# Altium footprint library 15EDG.PcbLib: 46 footprints (part 3 of 3)
Each footprint in its own frame and in the unit in brackets; x right, y up, seen from the top. Pads: shape width x height; smd on the part's side, far side on the other; paste and mask are expansions set on the pad; w line width, h text height; cw(c..) or ccw(c..) is an arc to the next point about the centre after c.
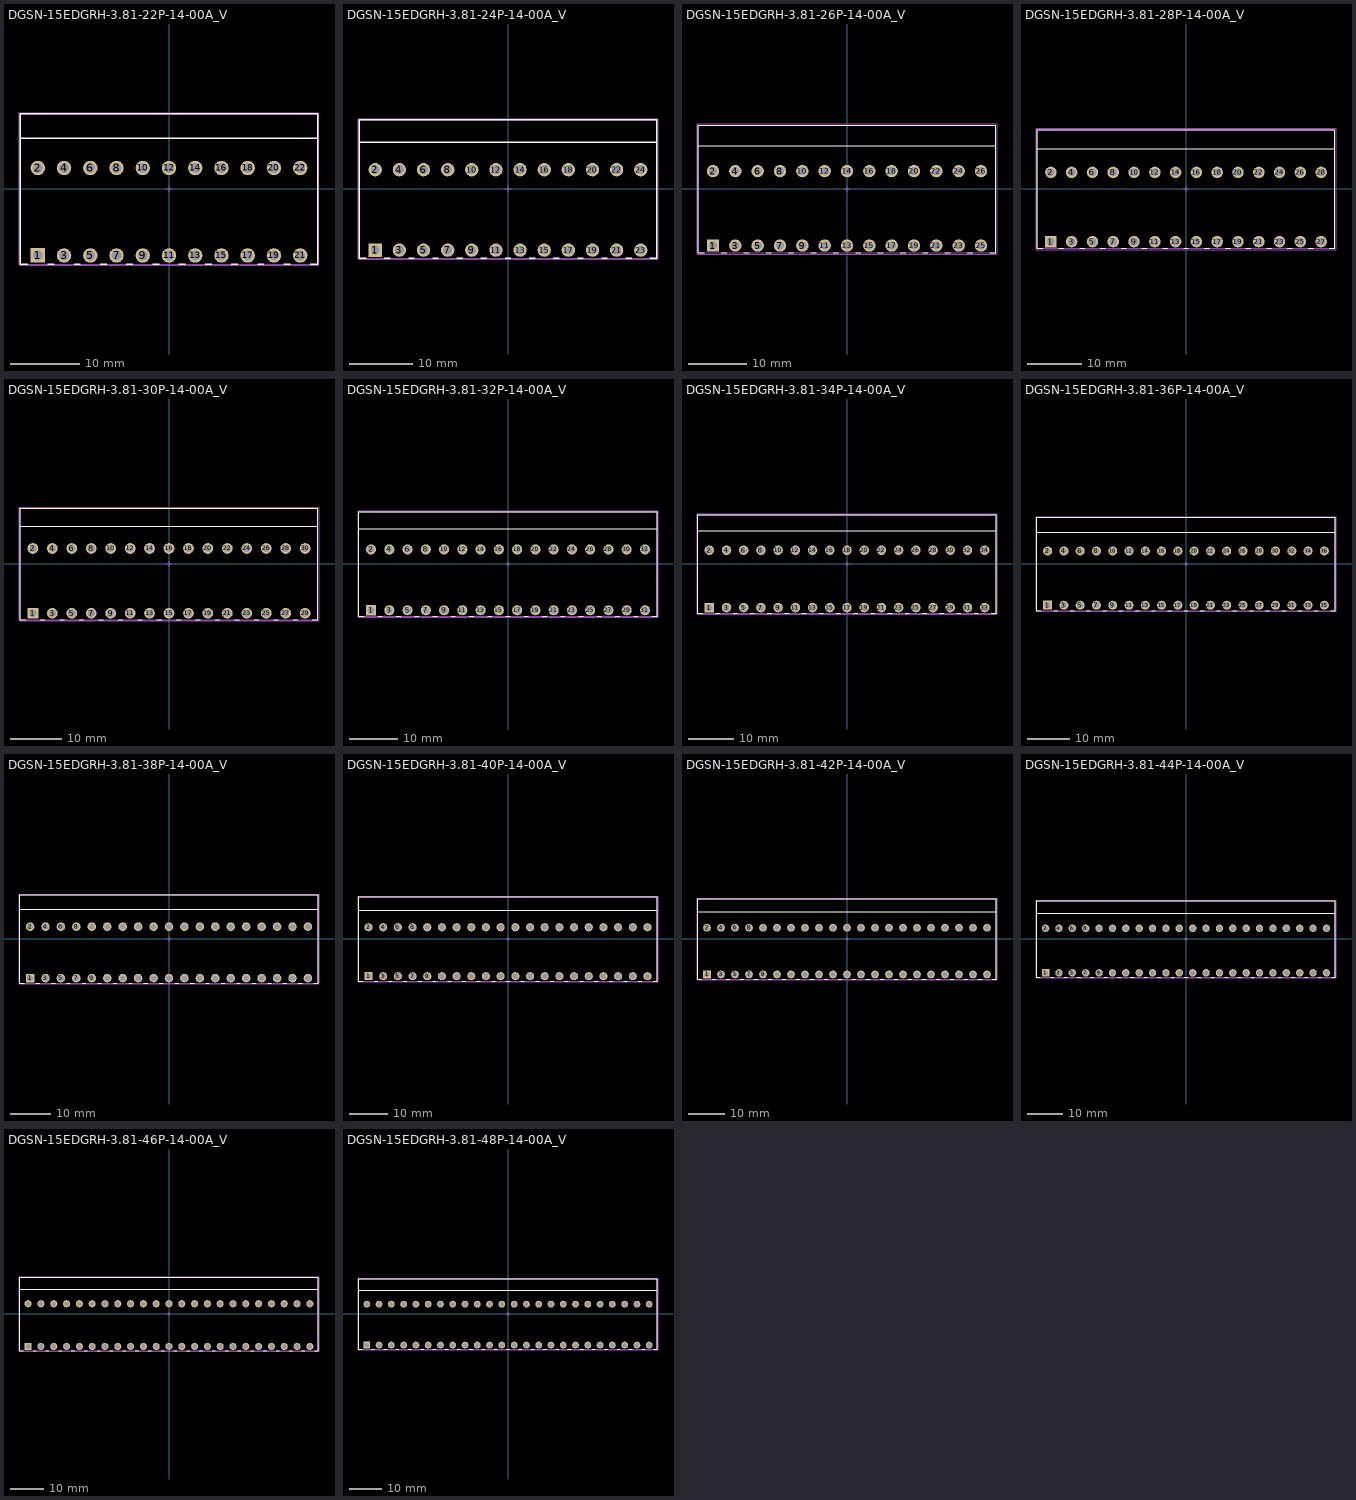
[diagram p2: the footprints below, top view; thin cyan lines are the x and y axes]

## DGSN-15EDGRH-3.81-22P-14-00A_V [mm] "Terminal Block, 22-Pin, Body 43.15x21.80mm, Pitch 3.81mm"
height 22.7
pads (22):
  rect 2.1x2.1 hole 1.4: 1(-19.05,-9.65)
  round 2.1 hole 1.4: 2(-19.05,3.05) 3(-15.24,-9.65) 4(-15.24,3.05) 5(-11.43,-9.65) 6(-11.43,3.05) 7(-7.62,-9.65) 8(-7.62,3.05) 9(-3.81,-9.65) 10(-3.81,3.05) 11(0,-9.65) 12(0,3.05) 13(3.81,-9.65) 14(3.81,3.05) 15(7.62,-9.65) 16(7.62,3.05) 17(11.43,-9.65) 18(11.43,3.05) 19(15.24,-9.65) 20(15.24,3.05) 21(19.05,-9.65) 22(19.05,3.05)
Top Overlay:
  lines w0.2: -21.575,7.4 21.575,7.4 ; -20.5,-10.9 -21.575,-10.9 -21.575,10.9 21.575,10.9 21.575,-10.9 20.5,-10.9 ; -17.6,-10.9 -16.69,-10.9 ; -13.79,-10.9 -12.88,-10.9 ; -9.98,-10.9 -9.07,-10.9 ; -6.17,-10.9 -5.26,-10.9 ; -2.36,-10.9 -1.45,-10.9 ; 1.45,-10.9 2.36,-10.9 ; 5.26,-10.9 6.17,-10.9 ; 9.07,-10.9 9.98,-10.9 ; 12.88,-10.9 13.79,-10.9 ; 16.69,-10.9 17.6,-10.9
Mechanical 13:
  lines w0.1: -21.575,-10.9 -21.575,10.9 21.575,10.9 21.575,-10.9 -21.575,-10.9
Mechanical 15:
  lines w0.05: -21.775,-11.1 -21.775,11.1 21.775,11.1 21.775,-11.1 -21.775,-11.1
  lines w0.1: -0.5,0 0.5,0 ; 0,-0.5 0,0.5
3D body "15EDGRH-3.81-22P-14-00AH.STEP": height 22.7, standoff -3.5, extent -21.565,-10.9 21.575,10.9

## DGSN-15EDGRH-3.81-24P-14-00A_V [mm] "Terminal Block, 24-Pin, Body 46.96x21.80mm, Pitch 3.81mm"
height 22.7
pads (24):
  rect 2.1x2.1 hole 1.4: 1(-20.955,-9.65)
  round 2.1 hole 1.4: 2(-20.955,3.05) 3(-17.145,-9.65) 4(-17.145,3.05) 5(-13.335,-9.65) 6(-13.335,3.05) 7(-9.525,-9.65) 8(-9.525,3.05) 9(-5.715,-9.65) 10(-5.715,3.05) 11(-1.905,-9.65) 12(-1.905,3.05) 13(1.905,-9.65) 14(1.905,3.05) 15(5.715,-9.65) 16(5.715,3.05) 17(9.525,-9.65) 18(9.525,3.05) 19(13.335,-9.65) 20(13.335,3.05) 21(17.145,-9.65) 22(17.145,3.05) 23(20.955,-9.65) 24(20.955,3.05)
Top Overlay:
  lines w0.2: -23.48,7.4 23.48,7.4 ; -22.405,-10.9 -23.48,-10.9 -23.48,10.9 23.48,10.9 23.48,-10.9 22.405,-10.9 ; -19.505,-10.9 -18.595,-10.9 ; -15.695,-10.9 -14.785,-10.9 ; -11.885,-10.9 -10.975,-10.9 ; -8.075,-10.9 -7.165,-10.9 ; -4.265,-10.9 -3.355,-10.9 ; -0.455,-10.9 0.455,-10.9 ; 3.355,-10.9 4.265,-10.9 ; 7.165,-10.9 8.075,-10.9 ; 10.975,-10.9 11.885,-10.9 ; 14.785,-10.9 15.695,-10.9 ; 18.595,-10.9 19.505,-10.9
Mechanical 13:
  lines w0.1: -23.48,-10.9 -23.48,10.9 23.48,10.9 23.48,-10.9 -23.48,-10.9
Mechanical 15:
  lines w0.05: -23.68,-11.1 -23.68,11.1 23.68,11.1 23.68,-11.1 -23.68,-11.1
  lines w0.1: -0.5,0 0.5,0 ; 0,-0.5 0,0.5
3D body "15EDGRH-3.81-24P-14-00AH.STEP": height 22.7, standoff -3.5, extent -23.47,-10.9 23.48,10.9

## DGSN-15EDGRH-3.81-26P-14-00A_V [mm] "Terminal Block, 26-Pin, Body 50.77x21.80mm, Pitch 3.81mm"
height 22.7
pads (26):
  rect 2.1x2.1 hole 1.4: 1(-22.86,-9.65)
  round 2.1 hole 1.4: 2(-22.86,3.05) 3(-19.05,-9.65) 4(-19.05,3.05) 5(-15.24,-9.65) 6(-15.24,3.05) 7(-11.43,-9.65) 8(-11.43,3.05) 9(-7.62,-9.65) 10(-7.62,3.05) 11(-3.81,-9.65) 12(-3.81,3.05) 13(0,-9.65) 14(0,3.05) 15(3.81,-9.65) 16(3.81,3.05) 17(7.62,-9.65) 18(7.62,3.05) 19(11.43,-9.65) 20(11.43,3.05) 21(15.24,-9.65) 22(15.24,3.05) 23(19.05,-9.65) 24(19.05,3.05) 25(22.86,-9.65) 26(22.86,3.05)
Top Overlay:
  lines w0.2: -25.385,7.4 25.385,7.4 ; -24.31,-10.9 -25.385,-10.9 -25.385,10.9 25.385,10.9 25.385,-10.9 24.31,-10.9 ; -21.41,-10.9 -20.5,-10.9 ; -17.6,-10.9 -16.69,-10.9 ; -13.79,-10.9 -12.88,-10.9 ; -9.98,-10.9 -9.07,-10.9 ; -6.17,-10.9 -5.26,-10.9 ; -2.36,-10.9 -1.45,-10.9 ; 1.45,-10.9 2.36,-10.9 ; 5.26,-10.9 6.17,-10.9 ; 9.07,-10.9 9.98,-10.9 ; 12.88,-10.9 13.79,-10.9 ; 16.69,-10.9 17.6,-10.9 ; 20.5,-10.9 21.41,-10.9
Mechanical 13:
  lines w0.1: -25.385,-10.9 -25.385,10.9 25.385,10.9 25.385,-10.9 -25.385,-10.9
Mechanical 15:
  lines w0.05: -25.585,-11.1 -25.585,11.1 25.585,11.1 25.585,-11.1 -25.585,-11.1
  lines w0.1: -0.5,0 0.5,0 ; 0,-0.5 0,0.5
3D body "15EDGRH-3.81-26P-14-00AH.STEP": height 22.7, standoff -3.5, extent -25.375,-10.9 25.385,10.9

## DGSN-15EDGRH-3.81-28P-14-00A_V [mm] "Terminal Block, 28-Pin, Body 54.58x21.80mm, Pitch 3.81mm"
height 22.7
pads (28):
  rect 2.1x2.1 hole 1.4: 1(-24.765,-9.65)
  round 2.1 hole 1.4: 2(-24.765,3.05) 3(-20.955,-9.65) 4(-20.955,3.05) 5(-17.145,-9.65) 6(-17.145,3.05) 7(-13.335,-9.65) 8(-13.335,3.05) 9(-9.525,-9.65) 10(-9.525,3.05) 11(-5.715,-9.65) 12(-5.715,3.05) 13(-1.905,-9.65) 14(-1.905,3.05) 15(1.905,-9.65) 16(1.905,3.05) 17(5.715,-9.65) 18(5.715,3.05) 19(9.525,-9.65) 20(9.525,3.05) 21(13.335,-9.65) 22(13.335,3.05) 23(17.145,-9.65) 24(17.145,3.05) 25(20.955,-9.65) 26(20.955,3.05) 27(24.765,-9.65) 28(24.765,3.05)
Top Overlay:
  lines w0.2: -27.29,7.4 27.29,7.4 ; -26.215,-10.9 -27.29,-10.9 -27.29,10.9 27.29,10.9 27.29,-10.9 26.215,-10.9 ; -23.315,-10.9 -22.405,-10.9 ; -19.505,-10.9 -18.595,-10.9 ; -15.695,-10.9 -14.785,-10.9 ; -11.885,-10.9 -10.975,-10.9 ; -8.075,-10.9 -7.165,-10.9 ; -4.265,-10.9 -3.355,-10.9 ; -0.455,-10.9 0.455,-10.9 ; 3.355,-10.9 4.265,-10.9 ; 7.165,-10.9 8.075,-10.9 ; 10.975,-10.9 11.885,-10.9 ; 14.785,-10.9 15.695,-10.9 ; 18.595,-10.9 19.505,-10.9 ; 22.405,-10.9 23.315,-10.9
Mechanical 13:
  lines w0.1: -27.29,-10.9 -27.29,10.9 27.29,10.9 27.29,-10.9 -27.29,-10.9
Mechanical 15:
  lines w0.05: -27.49,-11.1 -27.49,11.1 27.49,11.1 27.49,-11.1 -27.49,-11.1
  lines w0.1: -0.5,0 0.5,0 ; 0,-0.5 0,0.5
3D body "15EDGRH-3.81-30P-14-00AH.STEP": height 22.7, standoff -3.5, extent -27.28,-10.9 31.1,10.9

## DGSN-15EDGRH-3.81-30P-14-00A_V [mm] "Terminal Block, 30-Pin, Body 58.39x21.80mm, Pitch 3.81mm"
height 22.7
pads (30):
  rect 2.1x2.1 hole 1.4: 1(-26.67,-9.65)
  round 2.1 hole 1.4: 2(-26.67,3.05) 3(-22.86,-9.65) 4(-22.86,3.05) 5(-19.05,-9.65) 6(-19.05,3.05) 7(-15.24,-9.65) 8(-15.24,3.05) 9(-11.43,-9.65) 10(-11.43,3.05) 11(-7.62,-9.65) 12(-7.62,3.05) 13(-3.81,-9.65) 14(-3.81,3.05) 15(0,-9.65) 16(0,3.05) 17(3.81,-9.65) 18(3.81,3.05) 19(7.62,-9.65) 20(7.62,3.05) 21(11.43,-9.65) 22(11.43,3.05) 23(15.24,-9.65) 24(15.24,3.05) 25(19.05,-9.65) 26(19.05,3.05) 27(22.86,-9.65) 28(22.86,3.05) 29(26.67,-9.65) 30(26.67,3.05)
Top Overlay:
  lines w0.2: -29.195,7.4 29.195,7.4 ; -28.12,-10.9 -29.195,-10.9 -29.195,10.9 29.195,10.9 29.195,-10.9 28.12,-10.9 ; -25.22,-10.9 -24.31,-10.9 ; -21.41,-10.9 -20.5,-10.9 ; -17.6,-10.9 -16.69,-10.9 ; -13.79,-10.9 -12.88,-10.9 ; -9.98,-10.9 -9.07,-10.9 ; -6.17,-10.9 -5.26,-10.9 ; -2.36,-10.9 -1.45,-10.9 ; 1.45,-10.9 2.36,-10.9 ; 5.26,-10.9 6.17,-10.9 ; 9.07,-10.9 9.98,-10.9 ; 12.88,-10.9 13.79,-10.9 ; 16.69,-10.9 17.6,-10.9 ; 20.5,-10.9 21.41,-10.9 ; 24.31,-10.9 25.22,-10.9
Mechanical 13:
  lines w0.1: -29.195,-10.9 -29.195,10.9 29.195,10.9 29.195,-10.9 -29.195,-10.9
Mechanical 15:
  lines w0.05: -29.395,-11.1 -29.395,11.1 29.395,11.1 29.395,-11.1 -29.395,-11.1
  lines w0.1: -0.5,0 0.5,0 ; 0,-0.5 0,0.5
3D body "15EDGRH-3.81-30P-14-00AH.STEP": height 22.7, standoff -3.5, extent -29.185,-10.9 29.195,10.9

## DGSN-15EDGRH-3.81-32P-14-00A_V [mm] "Terminal Block, 32-Pin, Body 62.20x21.80mm, Pitch 3.81mm"
height 22.7
pads (32):
  rect 2.1x2.1 hole 1.4: 1(-28.575,-9.65)
  round 2.1 hole 1.4: 2(-28.575,3.05) 3(-24.765,-9.65) 4(-24.765,3.05) 5(-20.955,-9.65) 6(-20.955,3.05) 7(-17.145,-9.65) 8(-17.145,3.05) 9(-13.335,-9.65) 10(-13.335,3.05) 11(-9.525,-9.65) 12(-9.525,3.05) 13(-5.715,-9.65) 14(-5.715,3.05) 15(-1.905,-9.65) 16(-1.905,3.05) 17(1.905,-9.65) 18(1.905,3.05) 19(5.715,-9.65) 20(5.715,3.05) 21(9.525,-9.65) 22(9.525,3.05) 23(13.335,-9.65) 24(13.335,3.05) 25(17.145,-9.65) 26(17.145,3.05) 27(20.955,-9.65) 28(20.955,3.05) 29(24.765,-9.65) 30(24.765,3.05) 31(28.575,-9.65) 32(28.575,3.05)
Top Overlay:
  lines w0.2: -31.1,7.4 31.1,7.4 ; -30.025,-10.9 -31.1,-10.9 -31.1,10.9 31.1,10.9 31.1,-10.9 30.025,-10.9 ; -27.125,-10.9 -26.215,-10.9 ; -23.315,-10.9 -22.405,-10.9 ; -19.505,-10.9 -18.595,-10.9 ; -15.695,-10.9 -14.785,-10.9 ; -11.885,-10.9 -10.975,-10.9 ; -8.075,-10.9 -7.165,-10.9 ; -4.265,-10.9 -3.355,-10.9 ; -0.455,-10.9 0.455,-10.9 ; 3.355,-10.9 4.265,-10.9 ; 7.165,-10.9 8.075,-10.9 ; 10.975,-10.9 11.885,-10.9 ; 14.785,-10.9 15.695,-10.9 ; 18.595,-10.9 19.505,-10.9 ; 22.405,-10.9 23.315,-10.9 ; 26.215,-10.9 27.125,-10.9
Mechanical 13:
  lines w0.1: -31.1,-10.9 -31.1,10.9 31.1,10.9 31.1,-10.9 -31.1,-10.9
Mechanical 15:
  lines w0.05: -31.3,-11.1 -31.3,11.1 31.3,11.1 31.3,-11.1 -31.3,-11.1
  lines w0.1: -0.5,0 0.5,0 ; 0,-0.5 0,0.5
3D body "15EDGRH-3.81-32P-14-00AH.STEP": height 22.7, standoff -3.5, extent -31.09,-10.9 31.1,10.9

## DGSN-15EDGRH-3.81-34P-14-00A_V [mm] "Terminal Block, 34-Pin, Body 66.01x21.80mm, Pitch 3.81mm"
height 22.7
pads (34):
  rect 2.1x2.1 hole 1.4: 1(-30.48,-9.65)
  round 2.1 hole 1.4: 2(-30.48,3.05) 3(-26.67,-9.65) 4(-26.67,3.05) 5(-22.86,-9.65) 6(-22.86,3.05) 7(-19.05,-9.65) 8(-19.05,3.05) 9(-15.24,-9.65) 10(-15.24,3.05) 11(-11.43,-9.65) 12(-11.43,3.05) 13(-7.62,-9.65) 14(-7.62,3.05) 15(-3.81,-9.65) 16(-3.81,3.05) 17(0,-9.65) 18(0,3.05) 19(3.81,-9.65) 20(3.81,3.05) 21(7.62,-9.65) 22(7.62,3.05) 23(11.43,-9.65) 24(11.43,3.05) 25(15.24,-9.65) 26(15.24,3.05) 27(19.05,-9.65) 28(19.05,3.05) 29(22.86,-9.65) 30(22.86,3.05) 31(26.67,-9.65) 32(26.67,3.05) 33(30.48,-9.65) 34(30.48,3.05)
Top Overlay:
  lines w0.2: -33.005,7.4 33.005,7.4 ; -31.93,-10.9 -33.005,-10.9 -33.005,10.9 33.005,10.9 33.005,-10.9 31.93,-10.9 ; -29.03,-10.9 -28.12,-10.9 ; -25.22,-10.9 -24.31,-10.9 ; -21.41,-10.9 -20.5,-10.9 ; -17.6,-10.9 -16.69,-10.9 ; -13.79,-10.9 -12.88,-10.9 ; -9.98,-10.9 -9.07,-10.9 ; -6.17,-10.9 -5.26,-10.9 ; -2.36,-10.9 -1.45,-10.9 ; 1.45,-10.9 2.36,-10.9 ; 5.26,-10.9 6.17,-10.9 ; 9.07,-10.9 9.98,-10.9 ; 12.88,-10.9 13.79,-10.9 ; 16.69,-10.9 17.6,-10.9 ; 20.5,-10.9 21.41,-10.9 ; 24.31,-10.9 25.22,-10.9 ; 28.12,-10.9 29.03,-10.9
Mechanical 13:
  lines w0.1: -33.005,-10.9 33.005,-10.9 33.005,10.9 -33.005,10.9 -33.005,-10.9
Mechanical 15:
  lines w0.05: -33.205,-11.1 33.205,-11.1 33.205,11.1 -33.205,11.1 -33.205,-11.1
  lines w0.1: -0.5,0 0.5,0 ; 0,-0.5 0,0.5
3D body "15EDGRH-3.81-34P-14-00AH.STEP": height 22.7, standoff -3.5, extent -32.995,-10.9 33.005,10.9

## DGSN-15EDGRH-3.81-36P-14-00A_V [mm] "Terminal Block, 36-Pin, Body 69.82x21.80mm, Pitch 3.81mm"
height 22.7
pads (36):
  rect 2.1x2.1 hole 1.4: 1(-32.385,-9.65)
  round 2.1 hole 1.4: 2(-32.385,3.05) 3(-28.575,-9.65) 4(-28.575,3.05) 5(-24.765,-9.65) 6(-24.765,3.05) 7(-20.955,-9.65) 8(-20.955,3.05) 9(-17.145,-9.65) 10(-17.145,3.05) 11(-13.335,-9.65) 12(-13.335,3.05) 13(-9.525,-9.65) 14(-9.525,3.05) 15(-5.715,-9.65) 16(-5.715,3.05) 17(-1.905,-9.65) 18(-1.905,3.05) 19(1.905,-9.65) 20(1.905,3.05) 21(5.715,-9.65) 22(5.715,3.05) 23(9.525,-9.65) 24(9.525,3.05) 25(13.335,-9.65) 26(13.335,3.05) 27(17.145,-9.65) 28(17.145,3.05) 29(20.955,-9.65) 30(20.955,3.05) 31(24.765,-9.65) 32(24.765,3.05) 33(28.575,-9.65) 34(28.575,3.05) 35(32.385,-9.65) 36(32.385,3.05)
Top Overlay:
  lines w0.2: -34.91,7.4 34.91,7.4 ; -33.835,-10.9 -34.91,-10.9 -34.91,10.9 34.91,10.9 34.91,-10.9 33.835,-10.9 ; -30.935,-10.9 -30.025,-10.9 ; -27.125,-10.9 -26.215,-10.9 ; -23.315,-10.9 -22.405,-10.9 ; -19.505,-10.9 -18.595,-10.9 ; -15.695,-10.9 -14.785,-10.9 ; -11.885,-10.9 -10.975,-10.9 ; -8.075,-10.9 -7.165,-10.9 ; -4.265,-10.9 -3.355,-10.9 ; -0.455,-10.9 0.455,-10.9 ; 3.355,-10.9 4.265,-10.9 ; 7.165,-10.9 8.075,-10.9 ; 10.975,-10.9 11.885,-10.9 ; 14.785,-10.9 15.695,-10.9 ; 18.595,-10.9 19.505,-10.9 ; 22.405,-10.9 23.315,-10.9 ; 26.215,-10.9 27.125,-10.9 ; 30.025,-10.9 30.935,-10.9
Mechanical 13:
  lines w0.1: -34.91,-10.9 34.91,-10.9 34.91,10.9 -34.91,10.9 -34.91,-10.9
Mechanical 15:
  lines w0.05: -35.11,-11.1 35.11,-11.1 35.11,11.1 -35.11,11.1 -35.11,-11.1
  lines w0.1: -0.5,0 0.5,0 ; 0,-0.5 0,0.5
3D body "15EDGRH-3.81-36P-14-00AH.STEP": height 22.7, standoff -3.5, extent -34.9,-10.9 34.91,10.9

## DGSN-15EDGRH-3.81-38P-14-00A_V [mm] "Terminal Block, 38-Pin, Body 73.63x21.80mm, Pitch 3.81mm"
height 22.7
pads (38):
  rect 2.1x2.1 hole 1.4: 1(-34.29,-9.65)
  round 2.1 hole 1.4: 2(-34.29,3.05) 3(-30.48,-9.65) 4(-30.48,3.05) 5(-26.67,-9.65) 6(-26.67,3.05) 7(-22.86,-9.65) 8(-22.86,3.05) 9(-19.05,-9.65) 10(-19.05,3.05) 11(-15.24,-9.65) 12(-15.24,3.05) 13(-11.43,-9.65) 14(-11.43,3.05) 15(-7.62,-9.65) 16(-7.62,3.05) 17(-3.81,-9.65) 18(-3.81,3.05) 19(0,-9.65) 20(0,3.05) 21(3.81,-9.65) 22(3.81,3.05) 23(7.62,-9.65) 24(7.62,3.05) 25(11.43,-9.65) 26(11.43,3.05) 27(15.24,-9.65) 28(15.24,3.05) 29(19.05,-9.65) 30(19.05,3.05) 31(22.86,-9.65) 32(22.86,3.05) 33(26.67,-9.65) 34(26.67,3.05) 35(30.48,-9.65) 36(30.48,3.05) 37(34.29,-9.65) 38(34.29,3.05)
Top Overlay:
  lines w0.2: -36.815,7.4 36.815,7.4 ; -35.74,-10.9 -36.815,-10.9 -36.815,10.9 36.815,10.9 36.815,-10.9 35.74,-10.9 ; -32.84,-10.9 -31.93,-10.9 ; -29.03,-10.9 -28.12,-10.9 ; -25.22,-10.9 -24.31,-10.9 ; -21.41,-10.9 -20.5,-10.9 ; -17.6,-10.9 -16.69,-10.9 ; -13.79,-10.9 -12.88,-10.9 ; -9.98,-10.9 -9.07,-10.9 ; -6.17,-10.9 -5.26,-10.9 ; -2.36,-10.9 -1.45,-10.9 ; 1.45,-10.9 2.36,-10.9 ; 5.26,-10.9 6.17,-10.9 ; 9.07,-10.9 9.98,-10.9 ; 12.88,-10.9 13.79,-10.9 ; 16.69,-10.9 17.6,-10.9 ; 20.5,-10.9 21.41,-10.9 ; 24.31,-10.9 25.22,-10.9 ; 28.12,-10.9 29.03,-10.9 ; 31.93,-10.9 32.84,-10.9
Mechanical 13:
  lines w0.1: -36.815,-10.9 36.815,-10.9 36.815,10.9 -36.815,10.9 -36.815,-10.9
Mechanical 15:
  lines w0.05: -37.015,-11.1 37.015,-11.1 37.015,11.1 -37.015,11.1 -37.015,-11.1
  lines w0.1: -0.5,0 0.5,0 ; 0,-0.5 0,0.5
3D body "15EDGRH-3.81-38P-14-00AH.STEP": height 22.7, standoff -3.5, extent -36.805,-10.9 36.815,10.9

## DGSN-15EDGRH-3.81-40P-14-00A_V [mm] "Terminal Block, 40-Pin, Body 77.44x21.80mm, Pitch 3.81mm"
height 22.7
pads (40):
  rect 2.1x2.1 hole 1.4: 1(-36.195,-9.65)
  round 2.1 hole 1.4: 2(-36.195,3.05) 3(-32.385,-9.65) 4(-32.385,3.05) 5(-28.575,-9.65) 6(-28.575,3.05) 7(-24.765,-9.65) 8(-24.765,3.05) 9(-20.955,-9.65) 10(-20.955,3.05) 11(-17.145,-9.65) 12(-17.145,3.05) 13(-13.335,-9.65) 14(-13.335,3.05) 15(-9.525,-9.65) 16(-9.525,3.05) 17(-5.715,-9.65) 18(-5.715,3.05) 19(-1.905,-9.65) 20(-1.905,3.05) 21(1.905,-9.65) 22(1.905,3.05) 23(5.715,-9.65) 24(5.715,3.05) 25(9.525,-9.65) 26(9.525,3.05) 27(13.335,-9.65) 28(13.335,3.05) 29(17.145,-9.65) 30(17.145,3.05) 31(20.955,-9.65) 32(20.955,3.05) 33(24.765,-9.65) 34(24.765,3.05) 35(28.575,-9.65) 36(28.575,3.05) 37(32.385,-9.65) 38(32.385,3.05) 39(36.195,-9.65) 40(36.195,3.05)
Top Overlay:
  lines w0.2: -38.72,7.4 38.72,7.4 ; -37.645,-10.9 -38.72,-10.9 -38.72,10.9 38.72,10.9 38.72,-10.9 37.645,-10.9 ; -34.745,-10.9 -33.835,-10.9 ; -30.935,-10.9 -30.025,-10.9 ; -27.125,-10.9 -26.215,-10.9 ; -23.315,-10.9 -22.405,-10.9 ; -19.505,-10.9 -18.595,-10.9 ; -15.695,-10.9 -14.785,-10.9 ; -11.885,-10.9 -10.975,-10.9 ; -8.075,-10.9 -7.165,-10.9 ; -4.265,-10.9 -3.355,-10.9 ; -0.455,-10.9 0.455,-10.9 ; 3.355,-10.9 4.265,-10.9 ; 7.165,-10.9 8.075,-10.9 ; 10.975,-10.9 11.885,-10.9 ; 14.785,-10.9 15.695,-10.9 ; 18.595,-10.9 19.505,-10.9 ; 22.405,-10.9 23.315,-10.9 ; 26.215,-10.9 27.125,-10.9 ; 30.025,-10.9 30.935,-10.9 ; 33.835,-10.9 34.745,-10.9
Mechanical 13:
  lines w0.1: -38.72,-10.9 -38.72,10.9 38.72,10.9 38.72,-10.9 -38.72,-10.9
Mechanical 15:
  lines w0.05: -38.92,-11.1 -38.92,11.1 38.92,11.1 38.92,-11.1 -38.92,-11.1
  lines w0.1: -0.5,0 0.5,0 ; 0,-0.5 0,0.5
3D body "15EDGRH-3.81-40P-14-00AH.STEP": height 22.7, standoff -3.5, extent -38.71,-10.9 38.72,10.9

## DGSN-15EDGRH-3.81-42P-14-00A_V [mm] "Terminal Block, 42-Pin, Body 81.25x21.80mm, Pitch 3.81mm"
height 22.7
pads (42):
  rect 2.1x2.1 hole 1.4: 1(-38.1,-9.65)
  round 2.1 hole 1.4: 2(-38.1,3.05) 3(-34.29,-9.65) 4(-34.29,3.05) 5(-30.48,-9.65) 6(-30.48,3.05) 7(-26.67,-9.65) 8(-26.67,3.05) 9(-22.86,-9.65) 10(-22.86,3.05) 11(-19.05,-9.65) 12(-19.05,3.05) 13(-15.24,-9.65) 14(-15.24,3.05) 15(-11.43,-9.65) 16(-11.43,3.05) 17(-7.62,-9.65) 18(-7.62,3.05) 19(-3.81,-9.65) 20(-3.81,3.05) 21(0,-9.65) 22(0,3.05) 23(3.81,-9.65) 24(3.81,3.05) 25(7.62,-9.65) 26(7.62,3.05) 27(11.43,-9.65) 28(11.43,3.05) 29(15.24,-9.65) 30(15.24,3.05) 31(19.05,-9.65) 32(19.05,3.05) 33(22.86,-9.65) 34(22.86,3.05) 35(26.67,-9.65) 36(26.67,3.05) 37(30.48,-9.65) 38(30.48,3.05) 39(34.29,-9.65) 40(34.29,3.05) 41(38.1,-9.65) 42(38.1,3.05)
Top Overlay:
  lines w0.2: -40.625,7.4 40.625,7.4 ; -39.55,-10.9 -40.625,-10.9 -40.625,10.9 40.625,10.9 40.625,-10.9 39.55,-10.9 ; -36.65,-10.9 -35.74,-10.9 ; -32.84,-10.9 -31.93,-10.9 ; -29.03,-10.9 -28.12,-10.9 ; -25.22,-10.9 -24.31,-10.9 ; -21.41,-10.9 -20.5,-10.9 ; -17.6,-10.9 -16.69,-10.9 ; -13.79,-10.9 -12.88,-10.9 ; -9.98,-10.9 -9.07,-10.9 ; -6.17,-10.9 -5.26,-10.9 ; -2.36,-10.9 -1.45,-10.9 ; 1.45,-10.9 2.36,-10.9 ; 5.26,-10.9 6.17,-10.9 ; 9.07,-10.9 9.98,-10.9 ; 12.88,-10.9 13.79,-10.9 ; 16.69,-10.9 17.6,-10.9 ; 20.5,-10.9 21.41,-10.9 ; 24.31,-10.9 25.22,-10.9 ; 28.12,-10.9 29.03,-10.9 ; 31.93,-10.9 32.84,-10.9 ; 35.74,-10.9 36.65,-10.9
Mechanical 13:
  lines w0.1: -40.625,-10.9 -40.625,10.9 40.625,10.9 40.625,-10.9 -40.625,-10.9
Mechanical 15:
  lines w0.05: -40.825,-11.1 -40.825,11.1 40.825,11.1 40.825,-11.1 -40.825,-11.1
  lines w0.1: -0.5,0 0.5,0 ; 0,-0.5 0,0.5
3D body "15EDGRH-3.81-42P-14-00AH.STEP": height 22.7, standoff -3.5, extent -40.615,-10.9 40.625,10.9

## DGSN-15EDGRH-3.81-44P-14-00A_V [mm] "Terminal Block, 44-Pin, Body 85.06x21.80mm, Pitch 3.81mm"
height 22.7
pads (44):
  rect 2.1x2.1 hole 1.4: 1(-40.005,-9.65)
  round 2.1 hole 1.4: 2(-40.005,3.05) 3(-36.195,-9.65) 4(-36.195,3.05) 5(-32.385,-9.65) 6(-32.385,3.05) 7(-28.575,-9.65) 8(-28.575,3.05) 9(-24.765,-9.65) 10(-24.765,3.05) 11(-20.955,-9.65) 12(-20.955,3.05) 13(-17.145,-9.65) 14(-17.145,3.05) 15(-13.335,-9.65) 16(-13.335,3.05) 17(-9.525,-9.65) 18(-9.525,3.05) 19(-5.715,-9.65) 20(-5.715,3.05) 21(-1.905,-9.65) 22(-1.905,3.05) 23(1.905,-9.65) 24(1.905,3.05) 25(5.715,-9.65) 26(5.715,3.05) 27(9.525,-9.65) 28(9.525,3.05) 29(13.335,-9.65) 30(13.335,3.05) 31(17.145,-9.65) 32(17.145,3.05) 33(20.955,-9.65) 34(20.955,3.05) 35(24.765,-9.65) 36(24.765,3.05) 37(28.575,-9.65) 38(28.575,3.05) 39(32.385,-9.65) 40(32.385,3.05) 41(36.195,-9.65) 42(36.195,3.05) 43(40.005,-9.65) 44(40.005,3.05)
Top Overlay:
  lines w0.2: -42.53,7.4 42.53,7.4 ; -41.455,-10.9 -42.53,-10.9 -42.53,10.9 42.53,10.9 42.53,-10.9 41.455,-10.9 ; -38.555,-10.9 -37.645,-10.9 ; -34.745,-10.9 -33.835,-10.9 ; -30.935,-10.9 -30.025,-10.9 ; -27.125,-10.9 -26.215,-10.9 ; -23.315,-10.9 -22.405,-10.9 ; -19.505,-10.9 -18.595,-10.9 ; -15.695,-10.9 -14.785,-10.9 ; -11.885,-10.9 -10.975,-10.9 ; -8.075,-10.9 -7.165,-10.9 ; -4.265,-10.9 -3.355,-10.9 ; -0.455,-10.9 0.455,-10.9 ; 3.355,-10.9 4.265,-10.9 ; 7.165,-10.9 8.075,-10.9 ; 10.975,-10.9 11.885,-10.9 ; 14.785,-10.9 15.695,-10.9 ; 18.595,-10.9 19.505,-10.9 ; 22.405,-10.9 23.315,-10.9 ; 26.215,-10.9 27.125,-10.9 ; 30.025,-10.9 30.935,-10.9 ; 33.835,-10.9 34.745,-10.9 ; 37.645,-10.9 38.555,-10.9
Mechanical 13:
  lines w0.1: -42.53,-10.9 42.53,-10.9 42.53,10.9 -42.53,10.9 -42.53,-10.9
Mechanical 15:
  lines w0.05: -42.73,-11.1 42.73,-11.1 42.73,11.1 -42.73,11.1 -42.73,-11.1
  lines w0.1: -0.5,0 0.5,0 ; 0,-0.5 0,0.5
3D body "15EDGRH-3.81-44P-14-00AH.STEP": height 22.7, standoff -3.5, extent -42.52,-10.9 42.53,10.9

## DGSN-15EDGRH-3.81-46P-14-00A_V [mm] "Terminal Block, 46-Pin, Body 88.87x21.80mm, Pitch 3.81mm"
height 22.7
pads (46):
  rect 2.1x2.1 hole 1.4: 1(-41.91,-9.65)
  round 2.1 hole 1.4: 2(-41.91,3.05) 3(-38.1,-9.65) 4(-38.1,3.05) 5(-34.29,-9.65) 6(-34.29,3.05) 7(-30.48,-9.65) 8(-30.48,3.05) 9(-26.67,-9.65) 10(-26.67,3.05) 11(-22.86,-9.65) 12(-22.86,3.05) 13(-19.05,-9.65) 14(-19.05,3.05) 15(-15.24,-9.65) 16(-15.24,3.05) 17(-11.43,-9.65) 18(-11.43,3.05) 19(-7.62,-9.65) 20(-7.62,3.05) 21(-3.81,-9.65) 22(-3.81,3.05) 23(0,-9.65) 24(0,3.05) 25(3.81,-9.65) 26(3.81,3.05) 27(7.62,-9.65) 28(7.62,3.05) 29(11.43,-9.65) 30(11.43,3.05) 31(15.24,-9.65) 32(15.24,3.05) 33(19.05,-9.65) 34(19.05,3.05) 35(22.86,-9.65) 36(22.86,3.05) 37(26.67,-9.65) 38(26.67,3.05) 39(30.48,-9.65) 40(30.48,3.05) 41(34.29,-9.65) 42(34.29,3.05) 43(38.1,-9.65) 44(38.1,3.05) 45(41.91,-9.65) 46(41.91,3.05)
Top Overlay:
  lines w0.2: -44.435,7.4 44.435,7.4 ; -43.36,-10.9 -44.435,-10.9 -44.435,10.9 44.435,10.9 44.435,-10.9 43.36,-10.9 ; -40.46,-10.9 -39.55,-10.9 ; -36.65,-10.9 -35.74,-10.9 ; -32.84,-10.9 -31.93,-10.9 ; -29.03,-10.9 -28.12,-10.9 ; -25.22,-10.9 -24.31,-10.9 ; -21.41,-10.9 -20.5,-10.9 ; -17.6,-10.9 -16.69,-10.9 ; -13.79,-10.9 -12.88,-10.9 ; -9.98,-10.9 -9.07,-10.9 ; -6.17,-10.9 -5.26,-10.9 ; -2.36,-10.9 -1.45,-10.9 ; 1.45,-10.9 2.36,-10.9 ; 5.26,-10.9 6.17,-10.9 ; 9.07,-10.9 9.98,-10.9 ; 12.88,-10.9 13.79,-10.9 ; 16.69,-10.9 17.6,-10.9 ; 20.5,-10.9 21.41,-10.9 ; 24.31,-10.9 25.22,-10.9 ; 28.12,-10.9 29.03,-10.9 ; 31.93,-10.9 32.84,-10.9 ; 35.74,-10.9 36.65,-10.9 ; 39.55,-10.9 40.46,-10.9
Mechanical 13:
  lines w0.1: -44.435,-10.9 44.435,-10.9 44.435,10.9 -44.435,10.9 -44.435,-10.9
Mechanical 15:
  lines w0.05: -44.635,-11.1 44.635,-11.1 44.635,11.1 -44.635,11.1 -44.635,-11.1
  lines w0.1: -0.5,0 0.5,0 ; 0,-0.5 0,0.5
3D body "15EDGRH-3.81-46P-14-00AH.STEP": height 22.7, standoff -3.5, extent -44.425,-10.9 44.435,10.9

## DGSN-15EDGRH-3.81-48P-14-00A_V [mm] "Terminal Block, 48-Pin, Body 92.68x21.80mm, Pitch 3.81mm"
height 22.7
pads (48):
  rect 2.1x2.1 hole 1.4: 1(-43.815,-9.65)
  round 2.1 hole 1.4: 2(-43.815,3.05) 3(-40.005,-9.65) 4(-40.005,3.05) 5(-36.195,-9.65) 6(-36.195,3.05) 7(-32.385,-9.65) 8(-32.385,3.05) 9(-28.575,-9.65) 10(-28.575,3.05) 11(-24.765,-9.65) 12(-24.765,3.05) 13(-20.955,-9.65) 14(-20.955,3.05) 15(-17.145,-9.65) 16(-17.145,3.05) 17(-13.335,-9.65) 18(-13.335,3.05) 19(-9.525,-9.65) 20(-9.525,3.05) 21(-5.715,-9.65) 22(-5.715,3.05) 23(-1.905,-9.65) 24(-1.905,3.05) 25(1.905,-9.65) 26(1.905,3.05) 27(5.715,-9.65) 28(5.715,3.05) 29(9.525,-9.65) 30(9.525,3.05) 31(13.335,-9.65) 32(13.335,3.05) 33(17.145,-9.65) 34(17.145,3.05) 35(20.955,-9.65) 36(20.955,3.05) 37(24.765,-9.65) 38(24.765,3.05) 39(28.575,-9.65) 40(28.575,3.05) 41(32.385,-9.65) 42(32.385,3.05) 43(36.195,-9.65) 44(36.195,3.05) 45(40.005,-9.65) 46(40.005,3.05) 47(43.815,-9.65) 48(43.815,3.05)
Top Overlay:
  lines w0.2: -46.34,7.4 46.34,7.4 ; -45.265,-10.9 -46.34,-10.9 -46.34,10.9 46.34,10.9 46.34,-10.9 45.265,-10.9 ; -42.365,-10.9 -41.455,-10.9 ; -38.555,-10.9 -37.645,-10.9 ; -34.745,-10.9 -33.835,-10.9 ; -30.935,-10.9 -30.025,-10.9 ; -27.125,-10.9 -26.215,-10.9 ; -23.315,-10.9 -22.405,-10.9 ; -19.505,-10.9 -18.595,-10.9 ; -15.695,-10.9 -14.785,-10.9 ; -11.885,-10.9 -10.975,-10.9 ; -8.075,-10.9 -7.165,-10.9 ; -4.265,-10.9 -3.355,-10.9 ; -0.455,-10.9 0.455,-10.9 ; 3.355,-10.9 4.265,-10.9 ; 7.165,-10.9 8.075,-10.9 ; 10.975,-10.9 11.885,-10.9 ; 14.785,-10.9 15.695,-10.9 ; 18.595,-10.9 19.505,-10.9 ; 22.405,-10.9 23.315,-10.9 ; 26.215,-10.9 27.125,-10.9 ; 30.025,-10.9 30.935,-10.9 ; 33.835,-10.9 34.745,-10.9 ; 37.645,-10.9 38.555,-10.9 ; 41.455,-10.9 42.365,-10.9
Mechanical 13:
  lines w0.1: -46.34,-10.9 -46.34,10.9 46.34,10.9 46.34,-10.9 -46.34,-10.9
Mechanical 15:
  lines w0.05: -46.54,-11.1 -46.54,11.1 46.54,11.1 46.54,-11.1 -46.54,-11.1
  lines w0.1: -0.5,0 0.5,0 ; 0,-0.5 0,0.5
3D body "15EDGRH-3.81-48P-14-00AH.STEP": height 22.7, standoff -3.5, extent -46.33,-10.9 46.34,10.9